# Altium integrated library integrated_library.IntLib: 18 symbols
Pins are listed as number, name and electrical type; pins without a type are passive.

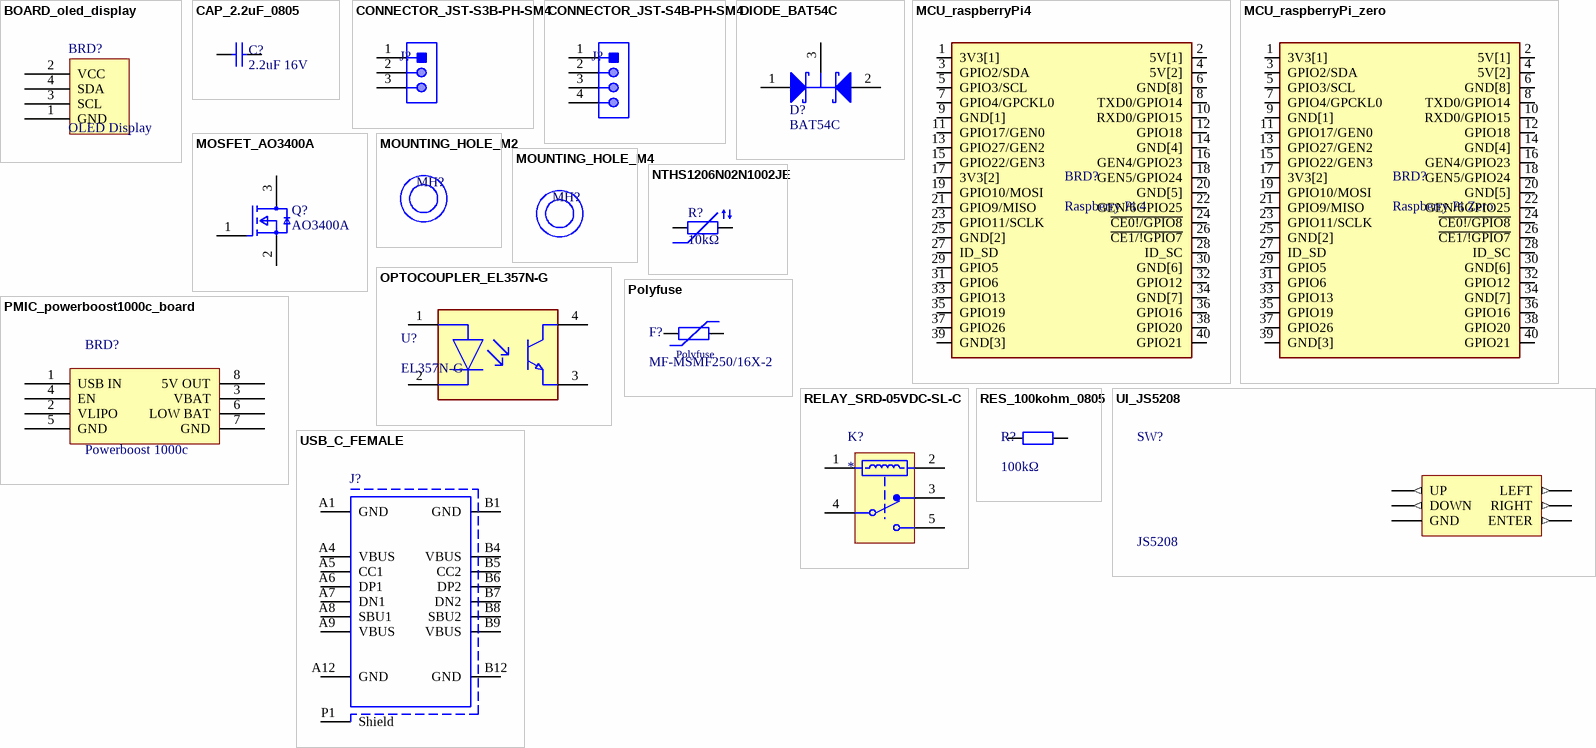
[diagram p0: symbols BOARD_oled_display to USB_C_FEMALE]

## BOARD_oled_display
designator BRD?, comment OLED Display
Manufacturer: Samtec; PartNumber: MMS-104-01-T-SV; Pitch: 2 mm; PackageDescription: 2mm Through Hole Box Connector Strip Assembly; DatasheetVersion: F-214; ComponentLink1URL: http://www.samtec.com; RoHS: True; Temperature Range: -55 to 105 degC; ComponentLink1Description: Manufacturer URL; Mounting Technology: Through-hole; ComponentLink2Description: Datasheet; Orientation: Vertical; ComponentLink2URL: http://www.samtec.com/documents/webfiles/pdf/MMS.PDF; ComponentLink3Description: Package Specification; ComponentLink3URL: http://www.samtec.com/documents/webfiles/cpdf/MMS-1XX-01-XXX-XX-XXX-MKT1.pdf; PackageVersion: AO, 2/1993; PackageReference: MMS-104-01-X-SV
footprint OLED_DISPLAY_BOARD
pins: 1 GND, 2 VCC, 3 SCL, 4 SDA

## CAP_2.2uF_0805
designator C?, comment 2.2uF 16V
Cap Ceramic 2.2uF 16V X7R 10% Pad SMD 0805 Soft Termination 125C Automotive T/R; Manufacturer: Murata; Manufacturer Part Number: GCJ21BR71C225KA13L; Supplier 1: Mouser; RoHS: Yes; Category: Ceramic Capacitors; Stock 1: 34901; Pricing 1: 1=0.49000, 10=0.34200, 50=0.34200, 100=0.20500, 500=0.15400, 1000=0.13000, 3000=0.12200, 6000=0.11600, 10000=0.11600 (USD); Mount: Surface Mount; Case/Package: 0805; Case Code (Metric): 2012; Case Code (Imperial): 0805; Min Operating Temperature: -55°C; Max Operating Temperature: 125°C; Capacitance: 2.2uF; Tolerance: 10%; Packaging: Tape and Reel; Voltage Rating: 16V; Dielectric: X7R; Voltage Rating (DC): 16V; Package Quantity: 1; Termination: SMD/SMT; Series: GCJ; Construction: Flat; Features: Soft Termination; Length: 2mm; Width: 0.049inch; Height: 1.25mm; Thickness: 0.057inch; Depth: 1.25mm; Ratings: AEC-Q200; Radiation Hardening: No; RoHS Compliant: Yes; Lead Free: Lead Free; ComponentLink1URL: https://datasheet.ciiva.com/172/product-172726.pdf?src-supplier=Digi-Key; ComponentLink1Description: https://datasheet.ciiva.com/172/product-172726.pdf?src-supplier=Digi-Key; ComponentLink2URL: https://datasheet.ciiva.com/172/s0717e-172727.pdf?src-supplier=Digi-Key; ComponentLink2Description: https://datasheet.ciiva.com/172/s0717e-172727.pdf?src-supplier=Digi-Key; ComponentLink3URL: https://datasheet.ciiva.com/172/s0717e-172728.pdf?src-supplier=Digi-Key; ComponentLink3Description: https://datasheet.ciiva.com/172/s0717e-172728.pdf?src-supplier=Digi-Key; Supplier Part Number 1: 81-GCJ21BR71C225KA3L
footprint CAP_0805 (Chip Capacitor, 2-Leads, Body 2.00x1.25mm, IPC Medium Density)
pins: 1, 2

## CONNECTOR_JST-S3B-PH-SM4
designator J?, comment JST-S3B-PH-SM4-TB-3_V  (value not drawn)
footprint JST-S3B-PH-SM4-TB-3_V (Header, 3-Leads, Body 9.9x7.6mm, Pitch 2mm)
pins: 1, 2, 3

## CONNECTOR_JST-S4B-PH-SM4
designator J?, comment JST-S4B-PH-SM4-TB-3_V  (value not drawn)
footprint JST-S4B-PH-SM4-TB-3_V (Header, 3-Leads, Body 9.9x7.6mm, Pitch 2mm)
pins: 1, 2, 3, 4

## DIODE_BAT54C
designator D?, comment BAT54C
Schottky Barrier Diode, 30 V, 3-Pin SOT23, RoHS, Tape and Reel; Manufacturer: NXP Semiconductors; Forward Surge Current Ifsm Max: 600mA; Pin Configuration: 1A1,2A2,3comK; Package Version: Feb-16; Forward Voltage VF Max: 800mV; SMD Marking: L43/*W1; Diode Case Style: SOT-23; Reverse Recovery Time trr Typ: 5ns; Forward Current If(AV): 200mA; Reel Quantity: 3000; SVHC: NoSVHC(19-Dec-2012); No. of Pins: 3; Junction Temperature Tj Max: 125degC; Common Connection: Cathode; Repetitive Reverse Voltage Vrrm Max: 30V; Operating Temperature Max: 150degC; Operating Temperature Range: -65degCto+150degC; Termination Type: SMD; Package Description: 3-Pin Small Outline Transistor, Body 1.3 x 2.9 mm, Pitch 0.95 mm; Package / Case: SOT-23; Diode Type: Schottky; Manufacturer URL: http://www.nxp.com/; Tape Width: 8mm; Package Reference: SOT23-3; Datasheet URL: https://datasheet.ciiva.com/33723/1668625-33723936.pdf; Datasheet Version: Rev. 5 , 10/2012; Operating Temperature Min: -65degC; Current Ifsm: 600mA; Reverse Recovery Time trr Max: 5ns; Package URL: http://www.nxp.com/documents/outline_drawing/SOT23.pdf; Forward Voltage: 800mV
footprint SOT-23
pins: 1 A, 2 A, 3 K

## MCU_raspberryPi4
designator BRD?, comment Raspberry Pi 4
Raspberry Pi 4 with Header; MP: ADA3708; Availability: Unavailable; Package: None; MF: Raspberry Pi; Value: *; Price: None; SnapEDA_Link: https://www.snapeda.com/parts/ADA3708/Raspberry%20Pi/view-part/2770118/?ref=snap
footprint RASPBERRY_PI_4_UPSIDEDOWN_BOARD
pins: 1 3V3[1] (power), 2 5V[1] (power), 3 GPIO2/SDA (io), 4 5V[2] (power), 5 GPIO3/SCL (io), 6 GND[8] (power), 7 GPIO4/GPCKL0 (io), 8 TXD0/GPIO14 (io), 9 GND[1] (power), 10 RXD0/GPIO15 (io), 11 GPIO17/GEN0 (io), 12 GPIO18 (io), 13 GPIO27/GEN2 (io), 14 GND[4] (power), 15 GPIO22/GEN3 (io), 16 GEN4/GPIO23 (io), 17 3V3[2] (power), 18 GEN5/GPIO24 (io), 19 GPIO10/MOSI (io), 20 GND[5] (power), 21 GPIO9/MISO (io), 22 GEN/6GPIO25 (io), 23 GPIO11/SCLK (io), 24 ~{CE0!/GPIO8} (io), 25 GND[2] (power), 26 ~{CE1/!GPIO7} (io), 27 ID_SD (io), 28 ID_SC (io), 29 GPIO5 (io), 30 GND[6] (power), 31 GPIO6 (io), 32 GPIO12 (io), 33 GPIO13 (io), 34 GND[7] (power), 35 GPIO19 (io), 36 GPIO16 (io), 37 GPIO26 (io), 38 GPIO20 (io), 39 GND[3] (power), 40 GPIO21 (io)

## MCU_raspberryPi_zero
designator BRD?, comment Raspberry Pi Zero
Raspberry Pi Zero with Header; MP: ADA3708; Availability: Unavailable; Package: None; MF: Raspberry Pi; Value: *; Price: None; SnapEDA_Link: https://www.snapeda.com/parts/ADA3708/Raspberry%20Pi/view-part/2770118/?ref=snap
footprint RASPBERRY_PI_ZERO
pins: 1 3V3[1] (power), 2 5V[1] (power), 3 GPIO2/SDA (io), 4 5V[2] (power), 5 GPIO3/SCL (io), 6 GND[8] (power), 7 GPIO4/GPCKL0 (io), 8 TXD0/GPIO14 (io), 9 GND[1] (power), 10 RXD0/GPIO15 (io), 11 GPIO17/GEN0 (io), 12 GPIO18 (io), 13 GPIO27/GEN2 (io), 14 GND[4] (power), 15 GPIO22/GEN3 (io), 16 GEN4/GPIO23 (io), 17 3V3[2] (power), 18 GEN5/GPIO24 (io), 19 GPIO10/MOSI (io), 20 GND[5] (power), 21 GPIO9/MISO (io), 22 GEN/6GPIO25 (io), 23 GPIO11/SCLK (io), 24 ~{CE0!/GPIO8} (io), 25 GND[2] (power), 26 ~{CE1/!GPIO7} (io), 27 ID_SD (io), 28 ID_SC (io), 29 GPIO5 (io), 30 GND[6] (power), 31 GPIO6 (io), 32 GPIO12 (io), 33 GPIO13 (io), 34 GND[7] (power), 35 GPIO19 (io), 36 GPIO16 (io), 37 GPIO26 (io), 38 GPIO20 (io), 39 GND[3] (power), 40 GPIO21 (io)

## MOSFET_AO3400A
designator Q?, comment AO3400A
MOSFET N-CH 30V 5.7A SOT23; Input Capacitance: 630pF; Number of Elements: 1; Rds On Max: 26.5mR; Max Power Dissipation: 1.4W; Gate to Source Voltage (Vgs): 12V; Min Operating Temperature: -55°C; Lead Free: Lead Free; Number of Pins: 3; Drain to Source Voltage (Vdss): 30V; Case/Package: SOT-23; Mount: Surface Mount; Continuous Drain Current (ID): 5.7A; Radiation Hardening: No; Packaging: Tape and Reel; Max Operating Temperature: 150°C; Power Dissipation: 1.4W
footprint SOT-23
pins: 1 G, 2 S, 3 D

## MOUNTING_HOLE_M2
designator MH?
footprint MOUNTING_HOLE_M2

## MOUNTING_HOLE_M4
designator MH?
footprint MOUNTING_HOLE_M4

## NTHS1206N02N1002JE
designator R?, comment 10kΩ
Thermistor NTC 10K Ohm 5% 2-Pin 1206 Surface Mount Solder Pad 3486K -4 to -3.5 T/R; Manufacturer: Vishay; Manufacturer Part Number: NTHS1206N02N1002JE; Tolerance: 10%; Resistance: 10kR; Power Rating: 280mW; Accuracy: 3%; Supplier 1: Digi-Key; RoHS: Yes; Category: Thermistors; Stock 1: 11661; Pricing 1: 1=2.54000, 5=2.40600, 10=2.06200, 25=1.64920, 50=1.51180, 100=1.37430, 500=1.20254, 1000=1.06511 (USD); Mount: Surface Mount; Case/Package: 1206; Number of Pins: 2; Case Code (Metric): 3216; Case Code (Imperial): 1206; Min Operating Temperature: -40°C; Max Operating Temperature: 125°C; Packaging: Tape and Reel; Package Quantity: 2000; Termination: SMD/SMT; Series: NTHS; Resistance Tolerance: 5%; Length: 3.2mm; Depth: 1.6mm; Radiation Hardening: No; REACH SVHC: Unknown; Lead Free: Lead Free; RoHS Compliant: Yes; ComponentLink1URL: https://datasheet.ciiva.com/3280/nths-3280368.pdf?src-supplier=Avnet; ComponentLink1Description: https://datasheet.ciiva.com/3280/nths-3280368.pdf?src-supplier=Avnet; ComponentLink2URL: https://datasheet.ciiva.com/15097/getdatasheetpartid-160952-15097741.pdf?src-supplier=Verical; ComponentLink2Description: https://datasheet.ciiva.com/15097/getdatasheetpartid-160952-15097741.pdf?src-supplier=Verical; ComponentLink3URL: https://datasheet.ciiva.com/2848/nths-2848964.pdf?src-supplier=Digi-Key; ComponentLink3Description: https://datasheet.ciiva.com/2848/nths-2848964.pdf?src-supplier=Digi-Key; ComponentLink4URL: https://datasheet.ciiva.com/2848/nths-2848965.pdf?src-supplier=Digi-Key; ComponentLink4Description: https://datasheet.ciiva.com/2848/nths-2848965.pdf?src-supplier=Digi-Key; ComponentLink5URL: https://datasheet.ciiva.com/2848/nths-2848966.pdf?src-supplier=Digi-Key; ComponentLink5Description: https://datasheet.ciiva.com/2848/nths-2848966.pdf?src-supplier=Digi-Key; ComponentLink6URL: https://datasheet.ciiva.com/7652/1748922-7652361.pdf?src-supplier=Element14; ComponentLink6Description: https://datasheet.ciiva.com/7652/1748922-7652361.pdf?src-supplier=Element14; ComponentLink7URL: https://datasheet.ciiva.com/16209/nths-16209405.pdf?src-supplier=Future+Electronics; ComponentLink7Description: https://datasheet.ciiva.com/16209/nths-16209405.pdf?src-supplier=Future+Electronics; ComponentLink8URL: https://datasheet.ciiva.com/4504/nths-4504574.pdf?src-supplier=Mouser; ComponentLink8Description: https://datasheet.ciiva.com/4504/nths-4504574.pdf?src-supplier=Mouser; Supplier Part Number 1: 541-1150-1-ND
footprint NTC_1206 (Chip Resistor, 2-Leads, Body 3.20x1.60mm, IPC Medium Density)
pins: 1, 2

## OPTOCOUPLER_EL357N-G
designator U?, comment EL357N-G
4 PIN SOP PHOTOTRANSISTOR PHOTOCOUPLER / CTR: 50~600% at IF =5mA, VCE =5V / 4 Pin SOP with a 2.0 mm profile; ComponentLink1Description: Datasheet; ComponentLink1URL: https://www.mouser.com/datasheet/2/143/201407061738295695-365680.pdf
footprint SOP-4_4mm
pins: 1 A, 2 C, 3 E, 4 C

## PMIC_powerboost1000c_board
designator BRD?, comment Powerboost 1000c
BOARD PWRBOOST1000 5V LIPO USB; Manufacturer: Adafruit Industries; Manufacturer Part Number: 2465; Evaluation Kit: Yes; Output Voltage: 5.2V; Output Current: 1A; Switching Frequency: 700kHz; Supplier 1: Digi-Key; RoHS: No; Category: Embedded Processors and Controllers; Stock 1: 834; Pricing 1: 1=19.95000 (USD); Package Quantity: 1; ComponentLink1URL: https://media.digikey.com/pdf/Data%20Sheets/Adafruit%20PDFs/2465_Web.pdf?src-supplier=Digi-Key; ComponentLink1Description: https://media.digikey.com/pdf/Data%20Sheets/Adafruit%20PDFs/2465_Web.pdf?src-supplier=Digi-Key; Supplier Part Number 1: 1528-1349-ND
footprint POWERBOOST1000C_BOARD
pins: 1 USB IN, 2 VLIPO, 3 VBAT, 4 EN, 5 GND, 6 LOW BAT, 7 GND, 8 5V OUT

## Polyfuse
designator F?, comment MF-MSMF250/16X-2
PTC Resettable Fuse 2.5A(hold) 5A(trip) 16V 100A 1.2W 5s 0.015Ohm SMD Solder Pad 1812 T/R; Manufacturer: Bourns; Number of Terminals/Pins: 2; Resistance: 100mR; Approvals: UL,CSA,TUV; Supplier 1: Digi-Key; RoHS: Yes; Category: Fuses; Stock 1: 33109; Pricing 1: 1=0.54000, 5=0.52000, 10=0.50400, 50=0.42400, 100=0.35200, 250=0.32000, 500=0.27200 (USD); Mount: Surface Mount,PCB; Case/Package: 1812; Case Code (Imperial): 1812; Case Code (Metric): 4532; Contact Plating: Gold; Min Operating Temperature: -40°C; Max Operating Temperature: 85°C; Hold Current: 2.5A; Trip Current: 5A; Max Current Rating: 100A; Power Dissipation: 1.2W; Current Rating: 100A; Time to Trip: 5s; Package Quantity: 1500; Packaging: Tape and Reel; Voltage Rating: 16V; Voltage Rating (DC): 16V; Termination: SMD/SMT; Length: 4.73mm; Width: 3.41mm; Height: 1.6mm; Radiation Hardening: No; REACH SVHC: No SVHC; ComponentLink1URL: https://datasheet.ciiva.com/3020/mfmsmf-3020420.pdf?src-supplier=Avnet; ComponentLink1Description: https://datasheet.ciiva.com/3020/mfmsmf-3020420.pdf?src-supplier=Avnet; ComponentLink2URL: https://datasheet.ciiva.com/16206/mfmsmf-16206071.pdf?src-supplier=Onlinecomponents.com; ComponentLink2Description: https://datasheet.ciiva.com/16206/mfmsmf-16206071.pdf?src-supplier=Onlinecomponents.com; ComponentLink3URL: https://datasheet.ciiva.com/7434/mfmsmf-7434296.pdf?src-supplier=Digi-Key; ComponentLink3Description: https://datasheet.ciiva.com/7434/mfmsmf-7434296.pdf?src-supplier=Digi-Key; ComponentLink4URL: https://datasheet.ciiva.com/32430/mf-msmf-series-eng-tds-32430600.pdf?src-supplier=Distrelec; ComponentLink4Description: https://datasheet.ciiva.com/32430/mf-msmf-series-eng-tds-32430600.pdf?src-supplier=Distrelec; ComponentLink5URL: https://datasheet.ciiva.com/7434/mfmsmf-7434298.pdf?src-supplier=Digi-Key; ComponentLink5Description: https://datasheet.ciiva.com/7434/mfmsmf-7434298.pdf?src-supplier=Digi-Key; ComponentLink6URL: https://datasheet.ciiva.com/16692/mfmsmf-16692202.pdf?src-supplier=Avnet+Europe; ComponentLink6Description: https://datasheet.ciiva.com/16692/mfmsmf-16692202.pdf?src-supplier=Avnet+Europe; ComponentLink7URL: https://datasheet.ciiva.com/30088/575mfmsmf-30088346.pdf?src-supplier=Onlinecomponents.com; ComponentLink7Description: https://datasheet.ciiva.com/30088/575mfmsmf-30088346.pdf?src-supplier=Onlinecomponents.com; ComponentLink8URL: https://datasheet.ciiva.com/7434/mfmsmf-7434299.pdf?src-supplier=Digi-Key; ComponentLink8Description: https://datasheet.ciiva.com/7434/mfmsmf-7434299.pdf?src-supplier=Digi-Key; ComponentLink9URL: https://datasheet.ciiva.com/14538/70153434-14538955.pdf?src-supplier=Allied+Electronics; ComponentLink9Description: https://datasheet.ciiva.com/14538/70153434-14538955.pdf?src-supplier=Allied+Electronics; ComponentLink10URL: https://datasheet.ciiva.com/8005/1786007-8005325.pdf?src-supplier=Element14; ComponentLink10Description: https://datasheet.ciiva.com/8005/1786007-8005325.pdf?src-supplier=Element14; ComponentLink11URL: https://datasheet.ciiva.com/48700/001055646-da-01-en-sich-ptc-reset-mf-msmf250-16x-2-2-5a16v-48700197.pdf?src-supplier=Conrad; ComponentLink11Description: https://datasheet.ciiva.com/48700/001055646-da-01-en-sich-ptc-reset-mf-msmf250-16x-2-2-5a16v-48700197.pdf?src-supplier=Conrad; Supplier Part Number 1: MF-MSMF250/16X-2CT-ND; Manufacturer Part Number: MF-MSMF250/16X-2
footprint FUSE_1812
pins: 1, 2

## RELAY_SRD-05VDC-SL-C
designator K?
5VDC SPDT Relay; Switching power: 240W; Max. AC current: 3A; Max. DC current: 7A; ca: 7A
footprint SRD-05-VDC-SL-C (12V Relay)
pins: 1, 2, 3 NC, 4 COM, 5 NO

## RES_100kohm_0805
designator R?, comment 100kΩ
Res Thick Film 0805 100K Ohm 1% 0.125W(1/8W) ±100ppm/°C Molded SMD Punched Carrier T/R; Manufacturer: Panasonic; Manufacturer Part Number: ERJ-6ENF1003V; Resistance: 100kR; Max Power Dissipation: 125mW; Voltage Rating (DC): 150V; Supplier 1: Mouser; RoHS: Yes; Category: Chip SMD Resistors; Stock 1: 3449; Pricing 1: 1=0.11000, 10=0.08300, 50=0.08300, 100=0.03200, 1000=0.01400, 2500=0.01300, 5000=0.01000, 10000=0.01000 (USD); Mount: Surface Mount; Case/Package: 0805; Number of Pins: 2; Case Code (Metric): 2012; Case Code (Imperial): 0805; Contact Plating: Tin; Min Operating Temperature: -55°C; Max Operating Temperature: 155°C; Tolerance: 1%; Packaging: Tape and Reel; Number of Terminations: 2; Temperature Coefficient: 100ppm/°C; Resistor Type: Thick Film; Features: Automotive AEC-Q200; Power Rating: 125mW; Package Quantity: 1; Voltage Rating: 150V; Termination: SMD/SMT; Length: 2mm; Width: 0.049inch; Height: 0.6mm; Depth: 1.25mm; Radiation Hardening: No; Lead Free: Lead Free; Military Standard: Not; REACH SVHC: No SVHC; ComponentLink1URL: https://datasheet.ciiva.com/11821/0900766b80f80784-11821507.pdf?src-supplier=RSComponents; ComponentLink1Description: https://datasheet.ciiva.com/11821/0900766b80f80784-11821507.pdf?src-supplier=RSComponents; ComponentLink2URL: https://datasheet.ciiva.com/22723/426256-22723909.pdf?src-supplier=Element14; ComponentLink2Description: https://datasheet.ciiva.com/22723/426256-22723909.pdf?src-supplier=Element14; ComponentLink3URL: https://datasheet.ciiva.com/46419/1678782-46419877.pdf?src-supplier=Element14; ComponentLink3Description: https://datasheet.ciiva.com/46419/1678782-46419877.pdf?src-supplier=Element14; ComponentLink4URL: https://datasheet.ciiva.com/27055/1988989-27055734.pdf?src-supplier=Jameco; ComponentLink4Description: https://datasheet.ciiva.com/27055/1988989-27055734.pdf?src-supplier=Jameco; ComponentLink5URL: https://datasheet.ciiva.com/16449/aoa0000ce2-16449480.pdf?src-supplier=Future+Electronics; ComponentLink5Description: https://datasheet.ciiva.com/16449/aoa0000ce2-16449480.pdf?src-supplier=Future+Electronics; ComponentLink6URL: https://datasheet.ciiva.com/17208/aoa0000ce2-17208153.pdf?src-supplier=Avnet+Europe; ComponentLink6Description: https://datasheet.ciiva.com/17208/aoa0000ce2-17208153.pdf?src-supplier=Avnet+Europe; ComponentLink7URL: https://datasheet.ciiva.com/22667/1678782-22667897.pdf?src-supplier=Element14; ComponentLink7Description: https://datasheet.ciiva.com/22667/1678782-22667897.pdf?src-supplier=Element14; ComponentLink8URL: https://datasheet.ciiva.com/24023/aoa0000ce2-24023497.pdf?src-supplier=Mouser; ComponentLink8Description: https://datasheet.ciiva.com/24023/aoa0000ce2-24023497.pdf?src-supplier=Mouser; ComponentLink9URL: https://datasheet.ciiva.com/7830/426256-7830746.pdf?src-supplier=Element14; ComponentLink9Description: https://datasheet.ciiva.com/7830/426256-7830746.pdf?src-supplier=Element14; ComponentLink10URL: https://datasheet.ciiva.com/30257/aoa0000ce2-30257690.pdf?src-supplier=Onlinecomponents.com; ComponentLink10Description: https://datasheet.ciiva.com/30257/aoa0000ce2-30257690.pdf?src-supplier=Onlinecomponents.com; ComponentLink11URL: https://datasheet.ciiva.com/7830/426256-7830988.pdf?src-supplier=Element14; ComponentLink11Description: https://datasheet.ciiva.com/7830/426256-7830988.pdf?src-supplier=Element14; ComponentLink12URL: https://datasheet.ciiva.com/16776/70260748-16776892.pdf?src-supplier=Allied+Electronics; ComponentLink12Description: https://datasheet.ciiva.com/16776/70260748-16776892.pdf?src-supplier=Allied+Electronics; ComponentLink13URL: https://datasheet.ciiva.com/16788/70260748-16788734.pdf?src-supplier=Allied+Electronics; ComponentLink13Description: https://datasheet.ciiva.com/16788/70260748-16788734.pdf?src-supplier=Allied+Electronics; ComponentLink14URL: https://datasheet.ciiva.com/48531/aoa0000ce2-48531486.pdf?src-supplier=Avnet; ComponentLink14Description: https://datasheet.ciiva.com/48531/aoa0000ce2-48531486.pdf?src-supplier=Avnet; Supplier Part Number 1: 667-ERJ-6ENF1003V
footprint RES_0805 (Chip Resistor, 2-Leads, Body 2.00x1.25mm, IPC Medium Density)
pins: 1, 2

## UI_JS5208
designator SW?, comment JS5208
E-SWITCH - JS5208 - SWITCH, NAVIGATION, 5 POSITION, 20mA, SMD; Mechanical Life: 100000Cycles; Voltage Rating (DC): 15V; Operating Force: 500gf; Supplier 1: Digi-Key; Manufacturer: E-Switch; RoHS: Yes; Category: Switches; Stock 1: 2460; Pricing 1: 1=2.49000, 5=2.43200, 10=2.04400, 25=1.93360, 50=1.82320, 100=1.65750 (USD); Mount: Surface Mount; Number of Pins: 5; Contact Material: Silver; Min Operating Temperature: -20°C; Max Operating Temperature: 70°C; Termination: Gull Wing; Electrical Life: 100000Cycles; Current Rating: 20mA; Package Quantity: 300; Lead Free: Lead Free; REACH SVHC: No SVHC; ComponentLink1URL: https://datasheet.ciiva.com/1530/js5208-1530917.pdf?src-supplier=Element14; ComponentLink1Description: https://datasheet.ciiva.com/1530/js5208-1530917.pdf?src-supplier=Element14; ComponentLink2URL: https://datasheet.ciiva.com/12447/js5208-19824-12447191.pdf?src-supplier=Mouser; ComponentLink2Description: https://datasheet.ciiva.com/12447/js5208-19824-12447191.pdf?src-supplier=Mouser; ComponentLink3URL: https://datasheet.ciiva.com/2869/p200020c-2869289.pdf?src-supplier=Digi-Key; ComponentLink3Description: https://datasheet.ciiva.com/2869/p200020c-2869289.pdf?src-supplier=Digi-Key; ComponentLink4URL: https://datasheet.ciiva.com/16360/js5208-16360789.pdf?src-supplier=Future+Electronics; ComponentLink4Description: https://datasheet.ciiva.com/16360/js5208-16360789.pdf?src-supplier=Future+Electronics; Supplier Part Number 1: EG4561-ND; Manufacturer Part Number: JS5208
footprint BTN_JS5208
pins: A-U UP (out), B-L LEFT (out), C-D DOWN (out), COM GND (power), D-R RIGHT (out), E-BTN ENTER (out)

## USB_C_FEMALE
designator J?, comment 632723300011  (value not drawn)
USB 3.1 Type C Receptacle WR-COM, Horizontal, SMT / THT; Manufacturer: Wurth Elektronik; Rated Current: 5A; Contact Resistance: 30mOhm; Working Voltage: 20VDC; Operating Temperature: -40to105degC; Package Reference: 632723300011; Datasheet URL: https://katalog.we-online.de/em/datasheet/632723x00011%282%29.pdf; Manufacturer URL: http://www.we-online.de; Connector Type: USB3.1TypeC; Gender: Receptacle; Part Number: 632723300011; Mounting Technology: SMT/THT; Publisher: WurthElektronik; Packaging: TapeandReel; Orientation: Horizontal
footprint USB_C_FEMALE_THT (USB 2.0 Type C Receptacle Dip Type, PCB Top Mount)
pins: A1 GND, A4 VBUS, A5 CC1, A6 DP1, A7 DN1, A8 SBU1, A9 VBUS, A12 GND, B1 GND, B4 VBUS, B5 CC2, B6 DP2, B7 DN2, B8 SBU2, B9 VBUS, B12 GND, P1 Shield